# Altium footprint library HW_HOLLAND_NCDM_MONITOR_R1.PcbLib: 472 footprints (part 28 of 30)
Each footprint in its own frame and in the unit in brackets; x right, y up, seen from the top. Pads: shape width x height; smd on the part's side, far side on the other; paste and mask are expansions set on the pad; w line width, h text height; cw(c..) or ccw(c..) is an arc to the next point about the centre after c.
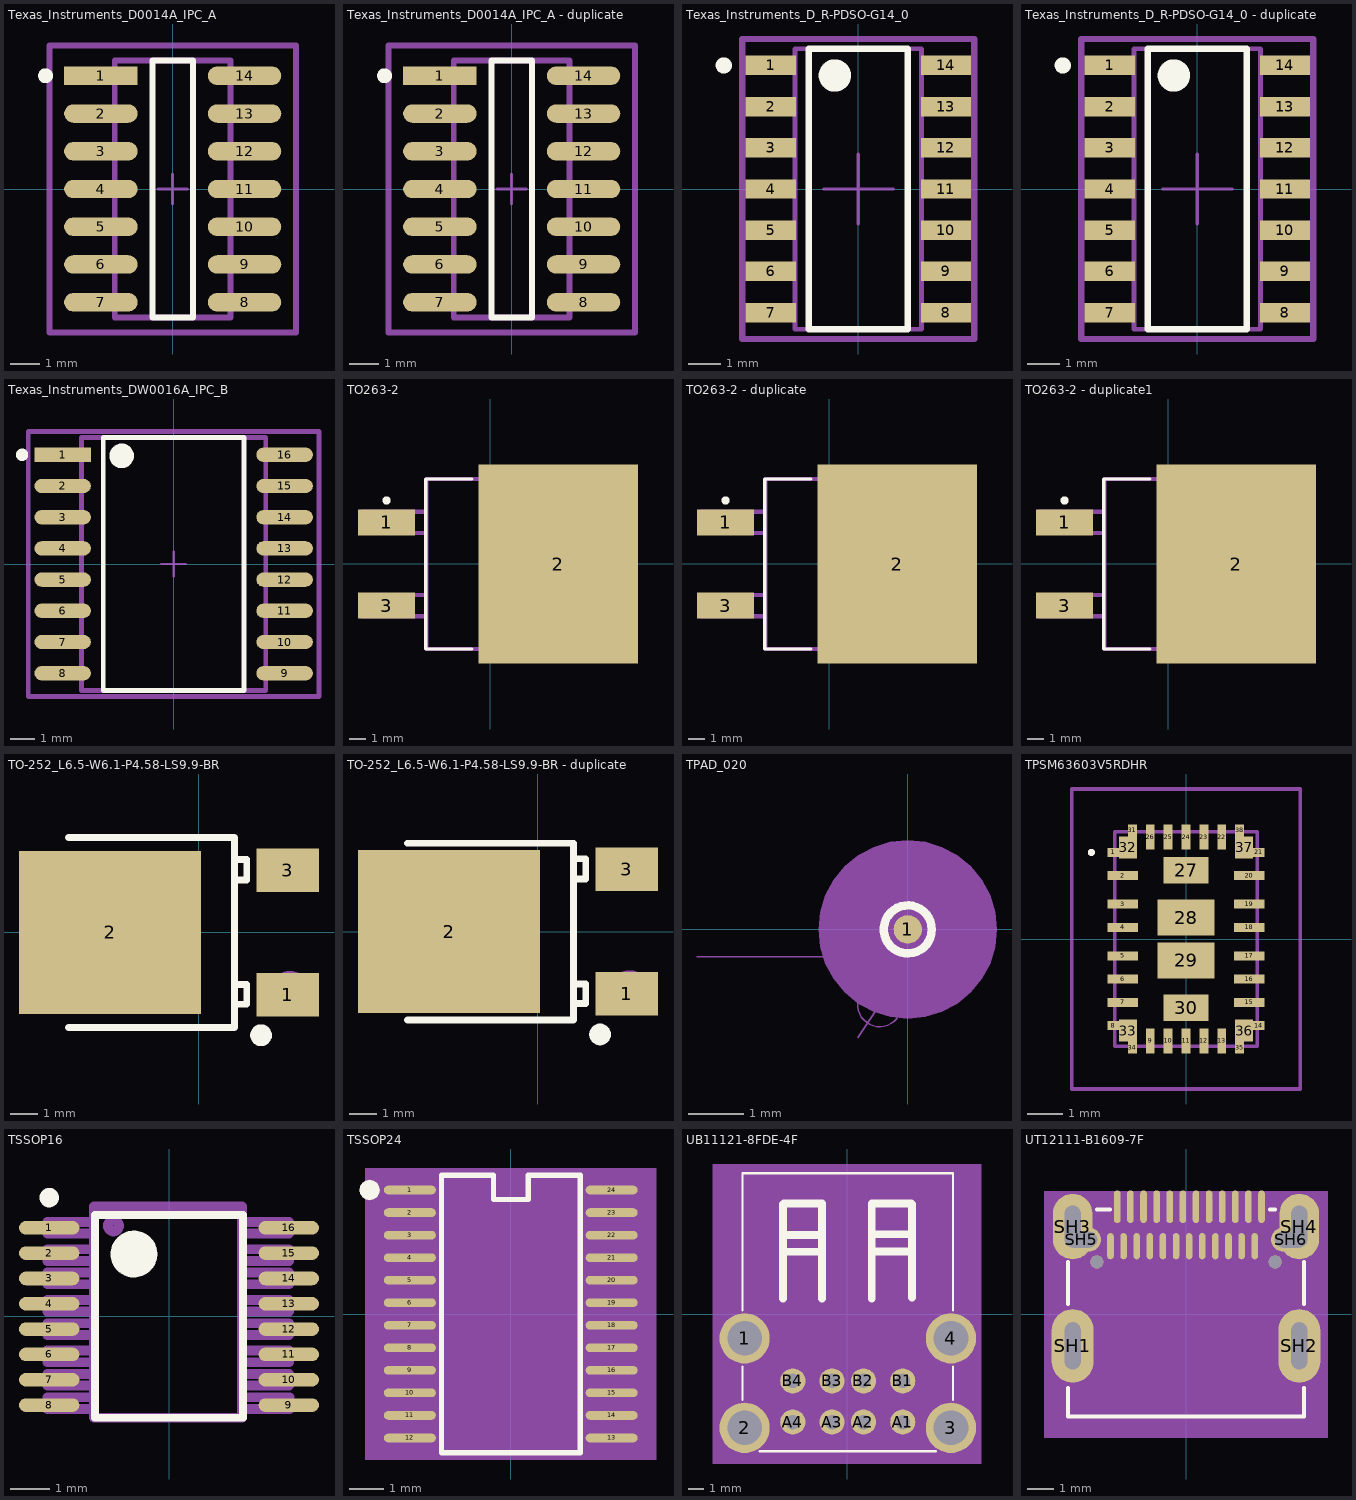
[diagram p27: the footprints below, top view; thin cyan lines are the x and y axes]

## Texas_Instruments_D0014A_IPC_A [mm]
pads (14):
  rect 2.474x0.622 smd paste+0 mask+0: 1(-2.416,3.81)
  rrect100% 2.474x0.622 smd paste+0 mask+0: 2(-2.416,2.54) 3(-2.416,1.27) 4(-2.416,0) 5(-2.416,-1.27) 6(-2.416,-2.54) 7(-2.416,-3.81) 8(2.416,-3.81) 9(2.416,-2.54) 10(2.416,-1.27) 11(2.416,0) 12(2.416,1.27) 13(2.416,2.54) 14(2.416,3.81)
Top Overlay:
  circle w0.25: c-4.278,3.81 r0.125
  lines w0.2: -0.679,-4.325 0.679,-4.325 0.679,4.325 -0.679,4.325 -0.679,-4.325
Top Courtyard:
  lines w0.2: -4.153,-4.825 4.153,-4.825 4.153,4.825 -4.153,4.825 -4.153,-4.825
  text ".Designator" at 0,0 h1
Mechanical 12:
  lines w0.2: -1.95,-4.325 1.95,-4.325 1.95,4.325 -1.95,4.325 -1.95,-4.325
Mechanical 15:
  lines w0.1: -0.5,0 0.5,0 ; 0,-0.5 0,0.5
  lines w0.2: -4.153,-4.825 4.153,-4.825 4.153,4.825 -4.153,4.825 -4.153,-4.825
3D body "IC_Texas_Instruments_LM339DR_eec.STEP": height 0.25, standoff 0, extent -4.153,-4.825 4.153,4.825

## Texas_Instruments_D0014A_IPC_A - duplicate [mm]
pads (14):
  rect 2.474x0.622 smd paste+0 mask+0: 1(-2.416,3.81)
  rrect100% 2.474x0.622 smd paste+0 mask+0: 2(-2.416,2.54) 3(-2.416,1.27) 4(-2.416,0) 5(-2.416,-1.27) 6(-2.416,-2.54) 7(-2.416,-3.81) 8(2.416,-3.81) 9(2.416,-2.54) 10(2.416,-1.27) 11(2.416,0) 12(2.416,1.27) 13(2.416,2.54) 14(2.416,3.81)
Top Overlay:
  circle w0.25: c-4.278,3.81 r0.125
  lines w0.2: -0.679,-4.325 0.679,-4.325 0.679,4.325 -0.679,4.325 -0.679,-4.325
Top Courtyard:
  lines w0.2: -4.153,-4.825 4.153,-4.825 4.153,4.825 -4.153,4.825 -4.153,-4.825
  text ".Designator" at 0,0 h1
Mechanical 12:
  lines w0.2: -1.95,-4.325 1.95,-4.325 1.95,4.325 -1.95,4.325 -1.95,-4.325
Mechanical 15:
  lines w0.1: -0.5,0 0.5,0 ; 0,-0.5 0,0.5
  lines w0.2: -4.153,-4.825 4.153,-4.825 4.153,4.825 -4.153,4.825 -4.153,-4.825
3D body "IC_Texas_Instruments_LM339DR_eec.STEP": height 0.25, standoff 0, extent -4.153,-4.825 4.153,4.825

## Texas_Instruments_D_R-PDSO-G14_0 [mm]
pads (14):
  rect 1.55x0.6 smd paste-1000 mask+0: 1(-2.7,3.81) 2(-2.7,2.54) 3(-2.7,1.27) 4(-2.7,0) 5(-2.7,-1.27) 6(-2.7,-2.54) 7(-2.7,-3.81) 8(2.7,-3.81) 9(2.7,-2.54) 10(2.7,-1.27) 11(2.7,0) 12(2.7,1.27) 13(2.7,2.54) 14(2.7,3.81)
Top Overlay:
  circle w0.5: c-0.725,3.5 r0.25
  circle w0.25: c-4.15,3.81 r0.125
  lines w0.2: -1.525,-4.325 -1.525,4.325 1.525,4.325 1.525,-4.325 -1.525,-4.325
Top Paste:
  rectangle: 1.95,-4.085 3.45,-3.535
  rectangle: 1.95,-2.815 3.45,-2.265
  rectangle: 1.95,-1.545 3.45,-0.995
  rectangle: 1.95,-0.275 3.45,0.275
  rectangle: 1.95,0.995 3.45,1.545
  rectangle: 1.95,2.265 3.45,2.815
  rectangle: 1.95,3.535 3.45,4.085
  rectangle: -3.45,-4.085 -1.95,-3.535
  rectangle: -3.45,-2.815 -1.95,-2.265
  rectangle: -3.45,-1.545 -1.95,-0.995
  rectangle: -3.45,-0.275 -1.95,0.275
  rectangle: -3.45,0.995 -1.95,1.545
  rectangle: -3.45,2.265 -1.95,2.815
  rectangle: -3.45,3.535 -1.95,4.085
Top Courtyard:
  lines w0.2: -3.575,-4.625 -3.575,4.625 3.575,4.625 3.575,-4.625 -3.575,-4.625
  text ".Designator" at 0,0 h1
Mechanical 12:
  lines w0.15: -1.95,-4.325 -1.95,4.325 1.95,4.325 1.95,-4.325 -1.95,-4.325
Mechanical 15:
  lines w0.1: -1.072,0 1.072,0 ; -0.5,0 0.5,0 ; 0,-1.072 0,1.072 ; 0,-0.5 0,0.5
  lines w0.2: -3.575,-4.625 -3.575,4.625 3.575,4.625 3.575,-4.625 -3.575,-4.625
3D body "IC_Texas_Instruments_LM339D_eec.STEP": height 0.25, standoff 0, extent -3.575,-4.625 3.575,4.625

## Texas_Instruments_D_R-PDSO-G14_0 - duplicate [mm]
pads (14):
  rect 1.55x0.6 smd paste-1000 mask+0: 1(-2.7,3.81) 2(-2.7,2.54) 3(-2.7,1.27) 4(-2.7,0) 5(-2.7,-1.27) 6(-2.7,-2.54) 7(-2.7,-3.81) 8(2.7,-3.81) 9(2.7,-2.54) 10(2.7,-1.27) 11(2.7,0) 12(2.7,1.27) 13(2.7,2.54) 14(2.7,3.81)
Top Overlay:
  circle w0.25: c-4.15,3.81 r0.125
  circle w0.5: c-0.725,3.5 r0.25
  lines w0.2: -1.525,-4.325 1.525,-4.325 1.525,4.325 -1.525,4.325 -1.525,-4.325
Top Paste:
  rectangle: -3.45,3.535 -1.95,4.085
  rectangle: -3.45,2.265 -1.95,2.815
  rectangle: -3.45,0.995 -1.95,1.545
  rectangle: -3.45,-0.275 -1.95,0.275
  rectangle: -3.45,-1.545 -1.95,-0.995
  rectangle: -3.45,-2.815 -1.95,-2.265
  rectangle: -3.45,-4.085 -1.95,-3.535
  rectangle: 1.95,3.535 3.45,4.085
  rectangle: 1.95,2.265 3.45,2.815
  rectangle: 1.95,0.995 3.45,1.545
  rectangle: 1.95,-0.275 3.45,0.275
  rectangle: 1.95,-1.545 3.45,-0.995
  rectangle: 1.95,-2.815 3.45,-2.265
  rectangle: 1.95,-4.085 3.45,-3.535
Top Courtyard:
  lines w0.2: -3.575,-4.625 3.575,-4.625 3.575,4.625 -3.575,4.625 -3.575,-4.625
  text ".Designator" at 0,0 h1
Mechanical 12:
  lines w0.15: -1.95,-4.325 1.95,-4.325 1.95,4.325 -1.95,4.325 -1.95,-4.325
Mechanical 15:
  lines w0.1: -1.072,0 1.072,0 ; -0.5,0 0.5,0 ; 0,-1.072 0,1.072 ; 0,-0.5 0,0.5
  lines w0.2: -3.575,-4.625 3.575,-4.625 3.575,4.625 -3.575,4.625 -3.575,-4.625
3D body "IC_Texas_Instruments_LM339D_eec.STEP": height 0.25, standoff 0, extent -3.575,-4.625 3.575,4.625

## Texas_Instruments_DW0016A_IPC_B [mm]
pads (16):
  rect 2.303x0.582 smd paste+0 mask+0: 1(-4.515,4.445)
  rrect100% 2.303x0.582 smd paste+0 mask+0: 2(-4.515,3.175) 3(-4.515,1.905) 4(-4.515,0.635) 5(-4.515,-0.635) 6(-4.515,-1.905) 7(-4.515,-3.175) 8(-4.515,-4.445) 9(4.516,-4.445) 10(4.516,-3.175) 11(4.515,-1.905) 12(4.516,-0.635) 13(4.516,0.635) 14(4.516,1.905) 15(4.516,3.175) 16(4.515,4.445)
Top Overlay:
  circle w0.5: c-2.114,4.4 r0.25
  circle w0.25: c-6.167,4.445 r0.125
  lines w0.2: -2.864,-5.15 2.864,-5.15 2.864,5.15 -2.864,5.15 -2.864,-5.15
Top Courtyard:
  lines w0.2: -5.917,-5.4 5.917,-5.4 5.917,5.4 -5.917,5.4 -5.917,-5.4
  text ".Designator" at 0,0.235 h1.25
Mechanical 12:
  lines w0.2: -3.75,-5.15 3.75,-5.15 3.75,5.15 -3.75,5.15 -3.75,-5.15
Mechanical 15:
  lines w0.1: -0.5,0 0.5,0 ; 0,-0.5 0,0.5
  lines w0.2: -5.917,-5.4 5.917,-5.4 5.917,5.4 -5.917,5.4 -5.917,-5.4
3D body "IC_Texas_Instruments_ISO1641DWR_eec.STEP": height 2.6, standoff 0, extent -5.165,-5.15 5.165,5.15

## TO263-2 [mm]
pads (3):
  rect 3.5x1.6 smd: 1(-6.35,2.54) 3(-6.35,-2.54)
  rect 9.75x12.2 smd: 2(4.15,0)
Top Overlay:
  circle w0.25: c-6.35,3.89 r0.125
  lines w0.2: -1.125,-5.2 -3.95,-5.2 -3.95,5.2 -1.125,5.2
Top Designator:
  lines w0.254: -3.9,-3.2 -7.9,-3.2 -7.9,-1.9 -3.9,-1.9 ; -3.9,1.9 -7.9,1.9 -7.9,3.2 -3.9,3.2 ; 8,-5.2 8,5.2 ; -3.9,-5.2 8.7,-5.2 8.7,5.2 -3.9,5.2 -3.9,-5.2
  text ".Designator" at -15.996,-1.27 h3.81
3D body "DPAK254P1555X480-3N.step": height 5, standoff 0, extent -6.745,-5.2 8.805,5.2

## TO263-2 - duplicate [mm]
pads (3):
  rect 3.5x1.6 smd: 1(-6.35,2.54) 3(-6.35,-2.54)
  rect 9.75x12.2 smd: 2(4.15,0)
Top Overlay:
  circle w0.25: c-6.35,3.89 r0.125
  lines w0.2: -1.125,-5.2 -3.95,-5.2 -3.95,5.2 -1.125,5.2
Top Designator:
  lines w0.254: -3.9,-3.2 -7.9,-3.2 -7.9,-1.9 -3.9,-1.9 ; -3.9,1.9 -7.9,1.9 -7.9,3.2 -3.9,3.2 ; 8,-5.2 8,5.2 ; -3.9,-5.2 8.7,-5.2 8.7,5.2 -3.9,5.2 -3.9,-5.2
  text ".Designator" at -15.996,-1.27 h3.81
3D body "DPAK254P1555X480-3N.step": height 5, standoff 0, extent -6.745,-5.2 8.805,5.2

## TO263-2 - duplicate1 [mm]
pads (3):
  rect 3.5x1.6 smd: 1(-6.35,2.54) 3(-6.35,-2.54)
  rect 9.75x12.2 smd: 2(4.15,0)
Top Overlay:
  circle w0.25: c-6.35,3.89 r0.125
  lines w0.2: -1.125,-5.2 -3.95,-5.2 -3.95,5.2 -1.125,5.2
Top Designator:
  lines w0.254: -3.9,-3.2 -7.9,-3.2 -7.9,-1.9 -3.9,-1.9 ; -3.9,1.9 -7.9,1.9 -7.9,3.2 -3.9,3.2 ; 8,-5.2 8,5.2 ; -3.9,-5.2 -3.9,5.2 8.7,5.2 8.7,-5.2 -3.9,-5.2
  text ".Designator" at 0.236,-0.282 h1.25
3D body "DPAK254P1555X480-3N.step": height 5, standoff 0, extent -6.745,-5.2 8.805,5.2

## TO-252_L6.5-W6.1-P4.58-LS9.9-BR [mm]
pads (3):
  rect 2.3x1.6 smd: 1(3.267,-2.29) 3(3.267,2.29)
  rect 6.7x6 smd: 2(-3.268,0)
Top Overlay:
  lines w0.254: -4.794,-3.5 -3.27,-3.5 -0.222,-3.5 1.302,-3.5 1.302,3.5 -4.794,3.5 ; 1.302,-2.642 1.759,-2.642 1.759,-1.919 1.302,-1.919 ; 1.302,1.93 1.759,1.93 1.759,2.679 1.302,2.679
  lines w0.4: 2.285,-3.581 ccw(c2.286,-3.781) 2.288,-3.581
Mechanical 15:
  circle w0.8: c3.359,-2.222 r0.4
3D body "TO252-DPAK.STP": height 2.29, standoff -0.09, extent -6.121,-3.29 3.8,3.29

## TO-252_L6.5-W6.1-P4.58-LS9.9-BR - duplicate [mm]
pads (3):
  rect 2.3x1.6 smd: 1(3.267,-2.29) 3(3.267,2.29)
  rect 6.7x6 smd: 2(-3.268,0)
Top Overlay:
  lines w0.254: -4.794,-3.251 1.302,-3.251 1.302,3.251 -4.794,3.251 ; 1.302,-2.642 1.759,-2.642 1.759,-1.919 1.302,-1.919 ; 1.302,1.93 1.759,1.93 1.759,2.679 1.302,2.679
  lines w0.4: 2.285,-3.581 ccw(c2.286,-3.781) 2.288,-3.581
Mechanical 15:
  circle w0.8: c3.359,-2.222 r0.4
3D body "TO252-DPAK.STP": height 2.29, standoff -0.09, extent -6.1,-3.24 3.821,3.341

## TPAD_020 [mil]
pads (1):
  round 20 smd: 1(0,0)
Top Overlay:
  circle w6: c0,0 r16.93
Top Assembly:
  circle w6: c0,0 r9.84
  text ".Designator" at -40.01,8.33 h25
Top 3D Body:
  region: 12.82,0 11.84,-4.9 9.06,-9.06 4.9,-11.84 0,-12.82 -4.9,-11.84 -6.3,-10.91 -9.06,-9.06 -11.84,-4.9 -12.82,0 -11.84,4.9 -9.06,9.06 -6.3,10.91 -4.9,11.84 0,12.82 4.9,11.84 9.06,9.06 11.84,4.9
Top Component Center:
  lines w1: -10,0 10,0 ; 0,-10 0,10
Top Courtyard:
  dashed: 12.82,0 11.84,-4.9 9.06,-9.06 4.9,-11.84 0,-12.82 -4.9,-11.84 -6.3,-10.91 -9.06,-9.06 -11.84,-4.9 -12.82,0 -11.84,4.9 -9.06,9.06 -6.3,10.91 -4.9,11.84 0,12.82 4.9,11.84 9.06,9.06 11.84,4.9
Mechanical 17:
  text "1" at -14,0 h35
Mechanical 24:
  circle w1: c-19.87,-53.11 r15.5
  dashed: -27.96,-21.17 -8.47,-5.01 -32.03,-14.29
  lines w1: -148.62,-19.11 -32.33,-19.11 -8.47,-5.01 ; -35.37,-76.36 -4.37,-29.87
  text "0.5" at -41.37,-37.61 h40
  text "PAD C020SXP" at 135.44,148.14 h40
  text "ALL DIMS. IN MM" at 183.24,103.4 h40
  text "tpad_020" at 59.69,-127.41 h40
Mechanical 25:
  dashed: 62.87,0 61.66,-12.27 58.09,-24.06 52.28,-34.93 44.46,-44.46 34.93,-52.28 24.06,-58.09 12.27,-61.66 0,-62.87 -12.27,-61.66 -24.06,-58.09 -31.3,-54.22 -34.93,-52.28 -44.46,-44.46 -52.28,-34.93 -58.09,-24.06 -61.66,-12.27 -62.87,0 -61.66,12.27 -58.09,24.06 -52.28,34.93 -44.46,44.46 -34.93,52.28 -31.3,54.22 -24.06,58.09 -12.27,61.66 0,62.87 12.27,61.66 24.06,58.09 34.93,52.28 44.46,44.46 52.28,34.93 58.09,24.06 61.66,12.27
3D body: height 150, standoff 0, extent -12.82,-12.82 12.82,12.82

## TPSM63603V5RDHR [mm]
pads (38):
  rect 0.325x0.25 smd: 1(-2.038,2.425) 8(-2.038,-2.425) 14(2.038,-2.425) 21(2.038,2.425)
  rect 0.85x0.25 smd: 2(-1.775,1.775) 3(-1.775,0.975) 4(-1.775,0.325) 5(-1.775,-0.475) 6(-1.775,-1.125) 7(-1.775,-1.775) 15(1.775,-1.775) 16(1.775,-1.125) 17(1.775,-0.475) 18(1.775,0.325) 19(1.775,0.975) 20(1.775,1.775)
  rect 0.25x0.7 smd: 9(-1,-2.85) 10(-0.5,-2.85) 11(0,-2.85) 12(0.5,-2.85) 13(1,-2.85) 22(1,2.85) 23(0.5,2.85) 24(0,2.85) 25(-0.5,2.85) 26(-1,2.85)
  rect 1.25x0.74 smd: 27(0,1.925) 30(0,-1.925)
  rect 1.6x1 smd: 28(0,0.6) 29(0,-0.6)
  rect 0.25x0.325 smd: 31(-1.5,3.038) 34(-1.5,-3.038) 35(1.5,-3.038) 38(1.5,3.038)
  rect 0.5x0.625 smd: 32(-1.625,2.563) 33(-1.625,-2.563) 36(1.625,-2.563) 37(1.625,2.563)
Top Overlay:
  lines w0.1: -2.7,2.425 cw(c-2.65,2.425) -2.6,2.425 cw(c-2.65,2.425) -2.7,2.425
Mechanical 15:
  lines w0.1: -2,-3 2,-3 2,3 -2,3 -2,-3
Mechanical 20:
  lines w0.1: -3.2,-4.2 3.2,-4.2 3.2,4.2 -3.2,4.2 -3.2,-4.2
3D body "RDH0030A.stp": height 1.9, standoff 0, extent -2,-3 2,3

## TSSOP16 [mm]
pads (16):
  oval 1.55x0.35 smd mask+0.05: 1(-3.075,2.275) 2(-3.075,1.625) 3(-3.075,0.975) 4(-3.075,0.325) 5(-3.075,-0.325) 6(-3.075,-0.975) 7(-3.075,-1.625) 8(-3.075,-2.275) 9(3.075,-2.275) 10(3.075,-1.625) 11(3.075,-0.975) 12(3.075,-0.325) 13(3.075,0.325) 14(3.075,0.975) 15(3.075,1.625) 16(3.075,2.275)
Top Overlay:
  circle w0.6: c-0.9,1.6 r0.3
  circle w0.25: c-3.075,3.05 r0.125
  lines w0.2: -1.9,-2.6 1.9,-2.6 1.9,2.6 -1.9,2.6 -1.9,-2.6
Top Designator:
  circle w0.254: c-1.425,2.325 r0.141
  lines w0.254: -1.925,-2.375 -3.125,-2.375 -3.125,-2.075 -1.925,-2.075 ; -1.925,-1.775 -3.125,-1.775 -3.125,-1.475 -1.925,-1.475 ; -1.925,-1.175 -3.125,-1.175 -3.125,-0.875 -1.925,-0.875 ; -1.925,-0.475 -3.125,-0.475 -3.125,-0.175 -1.925,-0.175 ; -1.925,0.125 -3.125,0.125 -3.125,0.425 -1.925,0.425 ; -1.925,0.825 -3.125,0.825 -3.125,1.125 -1.925,1.125 ; -1.925,1.425 -3.125,1.425 -3.125,1.725 -1.925,1.725 ; -1.925,2.125 -3.125,2.125 -3.125,2.425 -1.925,2.425 ; 1.875,-1.775 3.075,-1.775 3.075,-1.475 1.875,-1.475 ; 1.875,-1.175 3.075,-1.175 3.075,-0.875 1.875,-0.875 ; 1.875,-0.475 3.075,-0.475 3.075,-0.175 1.875,-0.175 ; 1.875,0.125 3.075,0.125 3.075,0.425 1.875,0.425 ; 1.875,0.825 3.075,0.825 3.075,1.125 1.875,1.125 ; 1.875,1.425 3.075,1.425 3.075,1.725 1.875,1.725 ; 1.875,2.125 3.075,2.125 3.075,2.425 1.875,2.425 ; 1.9,-2.375 3.1,-2.375 3.1,-2.075 1.9,-2.075 ; -1.925,-2.6 -1.925,2.825 1.875,2.825 1.875,-2.6 -1.925,-2.6
  text ".Designator" at -0.282,2.812 h1.25
3D body "TSSOP16.step": height 1.45, standoff 0, extent -3.2,-2.6 3.2,2.6

## TSSOP24 [mm]
pads (24):
  oval 1.5x0.25 smd: 1(-2.91,3.575) 2(-2.91,2.925) 3(-2.91,2.275) 4(-2.91,1.625) 5(-2.91,0.975) 6(-2.91,0.325) 7(-2.91,-0.325) 8(-2.91,-0.975) 9(-2.91,-1.625) 10(-2.91,-2.275) 11(-2.91,-2.925) 12(-2.91,-3.575) 13(2.91,-3.575) 14(2.91,-2.925) 15(2.91,-2.275) 16(2.91,-1.625) 17(2.91,-0.975) 18(2.91,-0.325) 19(2.91,0.325) 20(2.91,0.975) 21(2.91,1.625) 22(2.91,2.275) 23(2.91,2.925) 24(2.91,3.575)
Top Overlay:
  dashed: -4.07,3.865 -4.181,3.843 -4.275,3.78 -4.338,3.686 -4.36,3.575 -4.338,3.464 -4.317,3.433 -4.275,3.37 -4.181,3.307 -4.07,3.285 -3.959,3.307 -3.865,3.37 -3.823,3.433 -3.802,3.464 -3.78,3.575 -3.802,3.686 -3.865,3.78 -3.959,3.843
  lines w0.152: -2,-4 -2,4 -0.5,4 -0.5,3.3 0.5,3.3 0.5,4 2,4 2,-4 -2,-4
  text ".Designator" at 0.635,0.211 h0.64
Top Assembly:
  dashed: -4.07,3.865 -4.181,3.843 -4.275,3.78 -4.338,3.686 -4.36,3.575 -4.338,3.464 -4.317,3.433 -4.275,3.37 -4.181,3.307 -4.07,3.285 -3.959,3.307 -3.865,3.37 -3.823,3.433 -3.802,3.464 -3.78,3.575 -3.802,3.686 -3.865,3.78 -3.959,3.843
  lines w0.025: -2,-4 -2,4 -0.5,4 -0.5,3.3 0.5,3.3 0.5,4 2,4 2,-4 -2,-4
Top 3D Body:
  region: -4.2,4.2 -4.2,-4.2 4.2,-4.2 4.2,4.2
Mechanical 17:
  text "1" at -2.91,2.864 h0.89
  text "23" at 2.91,1.503 h0.89
  text "22" at 2.91,0.853 h0.89
  text "4" at -2.91,0.914 h0.89
  text "11" at -2.91,-4.347 h0.89
  text "9" at -2.91,-2.336 h0.89
  text "6" at -2.91,-0.386 h0.89
  text "10" at -2.91,-3.697 h0.89
  text "5" at -2.91,0.264 h0.89
  text "7" at -2.91,-1.036 h0.89
  text "8" at -2.91,-1.686 h0.89
  text "17" at 2.91,-2.398 h0.89
  text "14" at 2.91,-4.347 h0.89
  text "18" at 2.91,-1.748 h0.89
  text "16" at 2.91,-3.047 h0.89
  text "13" at 2.91,-4.997 h0.89
  text "15" at 2.91,-3.697 h0.89
  text "20" at 2.91,-0.447 h0.89
  text "19" at 2.91,-1.097 h0.89
  text "21" at 2.91,0.203 h0.89
  text "12" at -2.91,-4.997 h0.89
  text "3" at -2.91,1.564 h0.89
  text "2" at -2.91,2.214 h0.89
  text "24" at 2.91,2.153 h0.89
3D body: height 3.81, standoff 0, extent -4.2,-4.2 4.2,4.2

## UB11121-8FDE-4F [mm]
pads (12):
  round 3.2 hole 2.2: 1(-6.52,-1.55) 2(-6.52,-7.25) 3(6.62,-7.25) 4(6.62,-1.55)
  round 1.6 hole 0.92: A1(3.55,-6.88) A2(1.05,-6.88) A3(-0.95,-6.88) A4(-3.45,-6.88) B1(3.55,-4.26) B2(1.05,-4.26) B3(-0.95,-4.26) B4(-3.45,-4.26)
Top Overlay:
  lines w0.152: -6.65,-5.45 -6.65,-3.35 ; -6.65,0.25 -6.65,8.95 6.75,8.95 6.75,0.25 ; -5.55,-8.75 5.65,-8.75 ; 6.75,-5.45 6.75,-3.35
  lines w0.5: -4.09,3.963 -1.652,3.963 -1.601,3.912 ; -4.09,5.03 -1.601,5.03 ; -4.065,0.991 -4.065,6.986 -4.014,7.037 -1.601,7.037 -1.601,0.991 ; 1.574,0.991 1.574,7.011 1.599,7.037 4.088,7.037 4.139,6.986 4.139,1.042 ; 1.65,3.989 4.139,3.989 ; 1.675,5.081 4.038,5.081
  text ".Designator" at 0.953,0.212 h0.64
Top Assembly:
  lines w0.025: -6.656,-5.46 -6.656,-3.352 ; -6.656,0.255 -6.656,8.942 6.755,8.942 6.755,0.229 ; -5.564,-8.762 5.663,-8.762 ; -4.065,0.966 -4.065,7.037 -1.576,7.037 -1.576,0.966 ; -4.065,3.963 -1.576,3.963 ; -4.065,5.03 -1.576,5.03 ; 1.574,0.941 1.574,7.037 4.139,7.037 4.139,1.017 ; 1.574,3.989 4.139,3.989 ; 1.574,5.081 4.139,5.081 ; 6.755,-5.46 6.755,-3.327
Top 3D Body:
  region: -8.55,-9.55 8.55,-9.55 8.55,9.55 -8.55,9.55
Mechanical 17:
  text "B3" at 0.511,-4.66 h0.46
  text "B2" at 2.511,-4.66 h0.46
  text "A2" at 2.511,-7.28 h0.46
  text "A3" at 0.511,-7.28 h0.46
  text "4" at 8.042,-1.55 h1.78
  text "1" at -5.098,-1.55 h1.78
  text "3" at 8.042,-7.25 h1.78
  text "2" at -5.098,-7.25 h1.78
  text "B4" at -1.989,-4.66 h0.46
  text "A4" at -1.989,-7.28 h0.46
  text "A1" at 5.011,-7.28 h0.46
  text "B1" at 5.011,-4.66 h0.46
3D body: height 3.81, standoff 0, extent -8.55,-9.55 8.55,9.55

## UT12111-B1609-7F [mm]
pads (32):
  oval 0.25x1.25 smd: A1(-2.62,4.105) A2(-2.12,4.105) A3(-1.62,4.105) A4(-1.12,4.105) A5(-0.62,4.105) A6(-0.12,4.105) A7(0.38,4.105) A8(0.88,4.105) A9(1.38,4.105) A10(1.88,4.105) A11(2.38,4.105) A12(2.88,4.105)
  oval 0.25x1 smd: B1(2.62,2.6) B2(2.12,2.6) B3(1.62,2.6) B4(1.12,2.6) B5(0.62,2.6) B6(0.12,2.6) B7(-0.38,2.6) B8(-0.88,2.6) B9(-1.38,2.6) B10(-1.88,2.6) B11(-2.38,2.6) B12(-2.88,2.6)
  oval 1.6x2.8 hole 1.8 slot 0.6 at 0 deg: SH1(-4.32,-1.2) SH2(4.32,-1.2)
  oval 1.5x2.5 hole 1.6 slot 0.6 at 0 deg: SH3(-4.32,3.35) SH4(4.32,3.35)
  oval 1.5x0.9 hole 0.6 slot 1.2 at 0 deg: SH5(-3.99,2.85) SH6(3.99,2.85)
  round 0.5 hole 0.5 unplated: ""(-3.4,2) ""(3.4,2)
Top Overlay:
  lines w0.152: -4.5,-2.8 -4.5,-3.9 4.5,-3.9 4.5,-2.8 ; -4.5,0.4 -4.5,2 ; -3.4,4 -2.9,4 ; 3.2,4 3.4,4 ; 4.5,0.4 4.5,2
  text ".Designator" at -0.953,-0.212 h0.64
Top Assembly:
  lines w0.025: -4.5,-3.9 4.5,-3.9 4.5,4 -4.5,4 -4.5,-3.9
Top 3D Body:
  region: -5.4,4.7 -5.4,-4.7 5.4,-4.7 5.4,4.7
Mechanical 17:
  text "A8" at 0.514,4.105 h0.46
  text "B8" at -1.246,2.6 h0.46
  text "B10" at -2.429,2.6 h0.46
  text "A10" at 1.331,4.105 h0.46
  text "B11" at -2.929,2.6 h0.46
  text "A11" at 1.831,4.105 h0.46
  text "A3" at -1.986,4.105 h0.46
  text "B3" at 1.254,2.6 h0.46
  text "A2" at -2.486,4.105 h0.46
  text "B2" at 1.754,2.6 h0.46
  text "A7" at 0.014,4.105 h0.46
  text "B7" at -0.746,2.6 h0.46
  text "B5" at 0.254,2.6 h0.46
  text "A5" at -0.986,4.105 h0.46
  text "A6" at -0.486,4.105 h0.46
  text "B6" at -0.246,2.6 h0.46
  text "B9" at -1.746,2.6 h0.46
  text "A4" at -1.486,4.105 h0.46
  text "A9" at 1.014,4.105 h0.46
  text "B4" at 0.754,2.6 h0.46
  text "SH1" at -4.869,-1.2 h0.46
  text "SH2" at 3.771,-1.2 h0.46
  text "SH3" at -4.869,3.35 h0.46
  text "SH5" at -4.539,2.85 h0.46
  text "SH4" at 3.771,3.35 h0.46
  text "SH6" at 3.441,2.85 h0.46
  text "A1" at -2.986,4.105 h0.46
  text "B12" at -3.429,2.6 h0.46
  text "B1" at 2.254,2.6 h0.46
  text "A12" at 2.331,4.105 h0.46
3D body: height 3.81, standoff 0, extent -5.4,-4.7 5.4,4.7